# Altium footprint library DPIAT_202303.PcbLib: 77 footprints (part 4 of 5)
Each footprint in its own frame and in the unit in brackets; x right, y up, seen from the top. Pads: shape width x height; smd on the part's side, far side on the other; paste and mask are expansions set on the pad; w line width, h text height; cw(c..) or ccw(c..) is an arc to the next point about the centre after c.
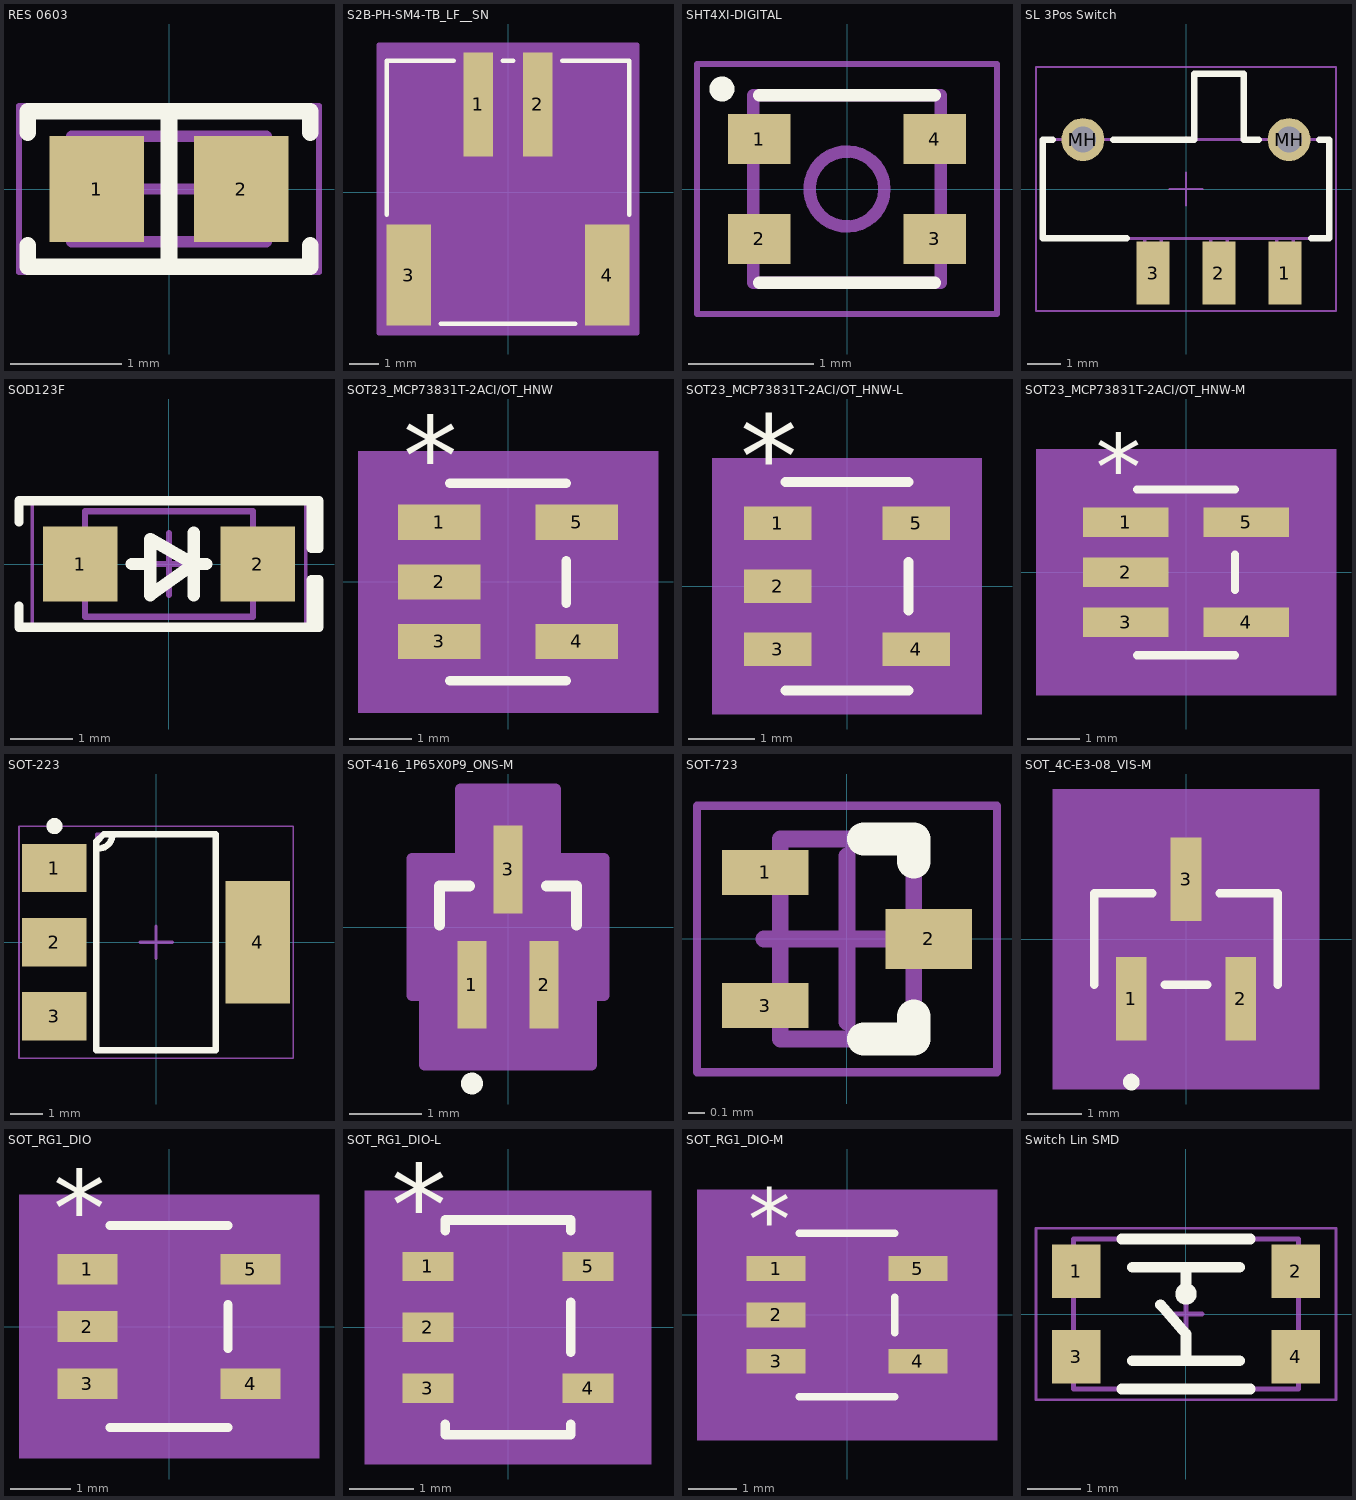
[diagram p3: the footprints below, top view; thin cyan lines are the x and y axes]

## RES 0603 [mm]
pads (2):
  rect 0.85x0.95 smd: 1(-0.65,0) 2(0.65,0)
Top Overlay:
  lines w0.15: -1.27,-0.508 -1.27,-0.7 1.27,-0.7 1.27,-0.508 ; -1.27,0.508 -1.27,0.7 1.27,0.7 1.27,0.508 ; 0,-0.7 0,0.7
Mechanical 13:
  lines w0.1: -0.875,-0.475 -0.875,0.475 0.875,0.475 0.875,-0.475 -0.875,-0.475
Mechanical 15:
  lines w0.05: -1.35,-0.75 -1.35,0.75 1.35,0.75 1.35,-0.75 -1.35,-0.75
  lines w0.1: -0.475,0 0.475,0 ; 0,-0.475 0,0.475
3D body "RES 0603.STEP": height 0.45, standoff 0, extent -0.825,-0.4 0.775,0.4

## S2B-PH-SM4-TB_LF__SN [mil] "Conn 2 pin smd horizontal S2B"
pads (4):
  rect 39x138 smd paste+0 mask+0: 1(-39.37,116.35) 2(39.37,116.35)
  rect 59x134 smd: 3(-131.89,-110.03) 4(131.89,-110.03)
Top Overlay:
  lines w6: -160.5,-29.93 -160.5,174.5 -71.97,174.5 ; -89.29,-174.5 89.29,-174.5 ; -6.77,174.5 6.77,174.5 ; 71.97,174.5 160.5,174.5 160.5,-29.93
Mechanical 5:
  region: -170.5,184.5 170.5,184.5 170.5,-184.5 -170.5,-184.5
Mechanical 13:
  lines w1: -155.5,-169.5 155.5,-169.5 155.5,169.5 -155.5,169.5 -155.5,-169.5
Mechanical 15:
  region: 171.39,195.35 -171.39,195.35 -171.39,-187.03 171.39,-187.03
  lines w6: -171.39,-187.03 -171.39,195.35 171.39,195.35 171.39,-187.03 -171.39,-187.03
3D body "S2B-PH-SM4-TB(LF)(SN)--3DModel-STEP-56544.STEP": height 216.54, standoff -3.94, extent -156.02,-169.29 155,169.29
3D body: height 10, standoff 0, extent 0,0 10,10

## SHT4XI-DIGITAL [mm]
pads (4):
  rect 0.5x0.4 smd: 1(-0.7,0.4) 2(-0.7,-0.4) 3(0.7,-0.4) 4(0.7,0.4)
Top Overlay:
  circle w0.1: c-1,0.8 r0.05
  lines w0.1: -0.7,-0.75 0.7,-0.75 ; -0.7,0.75 0.7,0.75
Mechanical 13:
  circle w0.1: c0,0 r0.3
  lines w0.1: -0.75,-0.75 0.75,-0.75 0.75,0.75 -0.75,0.75 -0.75,-0.75
Mechanical 15:
  lines w0.05: -1.2,-1 1.2,-1 1.2,1 -1.2,1 -1.2,-1
3D body "step_temp.STEP": height 0.59, standoff 0, extent -0.75,-0.75 0.75,0.75

## SL 3Pos Switch [mm] "Sliding 3 pos switch"
pads (5):
  rect 1x1.9 smd: 1(3,-2.55) 2(1,-2.55) 3(-1,-2.55)
  round 1.3 hole 0.8: MH(-3.125,1.5) MH(3.125,1.5)
Top Overlay:
  lines w0.2: -4.05,1.5 -4.35,1.5 -4.35,-1.5 -1.8,-1.5 ; -2.2,1.5 0.25,1.5 0.25,3.5 1.75,3.5 1.75,1.5 2.2,1.5 ; 3.8,-1.5 4.35,-1.5 4.35,1.5 4.05,1.5
Top Courtyard:
  lines w0.05: -0.5,0 0.5,0 ; 0,-0.5 0,0.5 ; -4.55,-3.7 4.55,-3.7 4.55,3.7 -4.55,3.7 -4.55,-3.7
Top Component Outline:
  lines w0.1: -1.25,-1.5 -1.25,-3 -0.75,-3 -0.75,-1.5 ; 0.25,1.5 0.25,3.5 1.75,3.5 1.75,1.5 ; 0.75,-1.5 0.75,-3 1.25,-3 1.25,-1.5 ; 2.75,-1.5 2.75,-3 3.25,-3 3.25,-1.5 ; -4.35,-1.5 -4.35,1.5 4.35,1.5 4.35,-1.5 -4.35,-1.5
3D body "450405020524.stp": height 1.98, standoff -0.62, extent -4.45,-3.05 4.45,3.5

## SOD123F [mm] "Footprint diode"
pads (2):
  rect 1.2x1.2 smd: 1(-1.427,0) 2(1.433,0)
Top Overlay:
  lines w0.15: -2.41,-0.675 -2.41,-1.016 2.289,-1.016 ; -2.41,0.675 -2.41,1.016 2.289,1.016 ; 2.289,-1.016 2.416,-1.016 2.416,-0.254 2.289,-0.254 2.289,-1.016 ; 2.289,1.016 2.289,0.254 2.416,0.254 2.416,1.016 2.289,1.016
  lines w0.2: -0.597,0 -0.297,0 ; 0.403,-0.5 0.403,0.5 ; 0.603,0 0.403,0 ; 0.403,0 -0.297,0.4 -0.297,-0.5 0.403,0
Mechanical 13:
  lines w0.1: -1.347,-0.85 -1.347,0.85 1.353,0.85 1.353,-0.85 -1.347,-0.85
Mechanical 15:
  lines w0.05: -2.197,-1 -2.197,1 2.203,1 2.203,-1 -2.197,-1
  lines w0.1: -0.497,0 0.503,0 ; 0.003,-0.5 0.003,0.5
3D body "SOD123F.STEP": height 1.1, standoff 0, extent -1.747,-0.8 1.753,0.8

## SOT23_MCP73831T-2ACI/OT_HNW [mil]
pads (5):
  rect 52x22 smd paste+0 mask+0: 1(-43.12,37.4) 2(-43.12,0) 3(-43.12,-37.4) 4(43.12,-37.4) 5(43.12,37.4)
Top Overlay:
  lines w6: -36.5,-62 36.5,-62 ; -36.5,62 36.5,62 ; 36.5,-13.3 36.5,13.3
  text "*" at -65.62,54.4 h50
Mechanical 5:
  region: 94.12,-82 -94.12,-82 -94.12,82 94.12,82
Mechanical 13:
  lines w0: -12,57 ccw(c0,57) 12,57
  lines w1: -55.12,-47.4 -31.5,-47.4 -31.5,-27.4 -55.12,-27.4 -55.12,-47.4 ; -55.12,-10 -31.5,-10 -31.5,10 -55.12,10 -55.12,-10 ; -55.12,27.4 -31.5,27.4 -31.5,47.4 -55.12,47.4 -55.12,27.4 ; -31.5,-57 -31.5,57 31.5,57 31.5,-57 -31.5,-57 ; 31.5,-47.4 55.12,-47.4 55.12,-27.4 31.5,-27.4 31.5,-47.4 ; 31.5,27.4 55.12,27.4 55.12,47.4 31.5,47.4 31.5,27.4
  text "*" at -29,4 h50
Mechanical 15:
  region: -41.5,-58.4 -79.12,-58.4 -79.12,58.4 -41.5,58.4 -41.5,67 41.5,67 41.5,58.4 79.12,58.4 79.12,-58.4 41.5,-58.4 41.5,-67 -41.5,-67
  lines w6: -79.12,-58.4 -41.5,-58.4 -41.5,-67 41.5,-67 41.5,-58.4 79.12,-58.4 79.12,58.4 41.5,58.4 41.5,67 -41.5,67 -41.5,58.4 -79.12,58.4 -79.12,-58.4
3D body: height 10, standoff 0, extent 0,0 10,10

## SOT23_MCP73831T-2ACI/OT_HNW-L [mil]
pads (5):
  rect 40x20 smd paste+0 mask+0: 1(-41.12,37.4) 2(-41.12,0) 3(-41.12,-37.4) 4(41.12,-37.4) 5(41.12,37.4)
Top Overlay:
  lines w6: -36.5,-62 36.5,-62 ; -36.5,62 36.5,62 ; 36.5,-14.3 36.5,14.3
  text "*" at -63.62,52.4 h50
Mechanical 5:
  region: 80.12,-76 -80.12,-76 -80.12,76 80.12,76
Mechanical 13:
  lines w0: -12,57 ccw(c0,57) 12,57
  lines w1: -55.12,-47.4 -55.12,-27.4 -31.5,-27.4 -31.5,-47.4 -55.12,-47.4 ; -55.12,-10 -55.12,10 -31.5,10 -31.5,-10 -55.12,-10 ; -55.12,27.4 -55.12,47.4 -31.5,47.4 -31.5,27.4 -55.12,27.4 ; -31.5,-57 31.5,-57 31.5,57 -31.5,57 -31.5,-57 ; 31.5,-47.4 31.5,-27.4 55.12,-27.4 55.12,-47.4 31.5,-47.4 ; 31.5,27.4 31.5,47.4 55.12,47.4 55.12,27.4 31.5,27.4
  text "*" at -29,4 h50
Mechanical 15:
  region: -35.5,-51.4 -65.12,-51.4 -65.12,51.4 -35.5,51.4 -35.5,61 35.5,61 35.5,51.4 65.12,51.4 65.12,-51.4 35.5,-51.4 35.5,-61 -35.5,-61
  lines w6: -65.12,-51.4 -65.12,51.4 -35.5,51.4 -35.5,61 35.5,61 35.5,51.4 65.12,51.4 65.12,-51.4 35.5,-51.4 35.5,-61 -35.5,-61 -35.5,-51.4 -65.12,-51.4
3D body: height 10, standoff 0, extent 0,0 10,10

## SOT23_MCP73831T-2ACI/OT_HNW-M [mil]
pads (5):
  rect 64x22 smd paste+0 mask+0: 1(-45.12,37.4) 2(-45.12,0) 3(-45.12,-37.4) 4(45.12,-37.4) 5(45.12,37.4)
Top Overlay:
  lines w6: -36.5,-62 36.5,-62 ; -36.5,62 36.5,62 ; 36.5,-13.3 36.5,13.3
  text "*" at -67.62,54.4 h50
Mechanical 5:
  region: 112.12,-92 -112.12,-92 -112.12,92 112.12,92
Mechanical 13:
  lines w0: -12,57 ccw(c0,57) 12,57
  lines w1: -55.12,-47.4 -55.12,-27.4 -31.5,-27.4 -31.5,-47.4 -55.12,-47.4 ; -55.12,-10 -55.12,10 -31.5,10 -31.5,-10 -55.12,-10 ; -55.12,27.4 -55.12,47.4 -31.5,47.4 -31.5,27.4 -55.12,27.4 ; -31.5,-57 31.5,-57 31.5,57 -31.5,57 -31.5,-57 ; 31.5,-47.4 31.5,-27.4 55.12,-27.4 55.12,-47.4 31.5,-47.4 ; 31.5,27.4 31.5,47.4 55.12,47.4 55.12,27.4 31.5,27.4
  text "*" at -29,4 h50
Mechanical 15:
  region: -51.5,-68.4 -97.12,-68.4 -97.12,68.4 -51.5,68.4 -51.5,77 51.5,77 51.5,68.4 97.12,68.4 97.12,-68.4 51.5,-68.4 51.5,-77 -51.5,-77
  lines w6: -97.12,-68.4 -97.12,68.4 -51.5,68.4 -51.5,77 51.5,77 51.5,68.4 97.12,68.4 97.12,-68.4 51.5,-68.4 51.5,-77 -51.5,-77 -51.5,-68.4 -97.12,-68.4
3D body: height 10, standoff 0, extent 0,0 10,10

## SOT-223 [mm] "For reg or other chip format SOT223"
pads (4):
  rect 2x1.5 smd: 1(-3.15,2.3) 2(-3.15,0) 3(-3.15,-2.3)
  rect 2x3.8 smd: 4(3.15,0)
Top Overlay:
  circle w0.25: c-3.15,3.6 r0.125
  lines w0.2: -1.85,2.9 -1.8,2.9 ccw(c-1.8,3.35) -1.35,3.35 ; -1.85,-3.35 1.85,-3.35 1.85,3.35 -1.625,3.35 -1.85,3.125 -1.85,-3.35
Mechanical 13:
  lines w0.1: -1.85,-3.35 -1.85,3.35 1.85,3.35 1.85,-3.35 -1.85,-3.35
Mechanical 15:
  lines w0.05: -4.25,-3.6 -4.25,3.6 4.25,3.6 4.25,-3.6 -4.25,-3.6
  lines w0.1: -0.5,0 0.5,0 ; 0,-0.5 0,0.5
3D body "SOT-223.STEP": height 1.8, standoff 0, extent -3.516,-3.25 3.5,3.25

## SOT-416_1P65X0P9_ONS-M [mil]
pads (3):
  rect 16x48 smd paste+0 mask+0: 1(-19.68,-31.5) 2(19.68,-31.5) 3(0,31.5)
Top Overlay:
  circle w6: c-19.68,-85.5 r3
  lines w6: -37.5,1.18 -37.5,22.5 -21.1,22.5 ; 21.1,22.5 37.5,22.5 37.5,1.18
Mechanical 13:
  circle w0: c-19.68,-7.5 r3
  lines w1: -32.5,-17.5 -32.5,17.5 32.5,17.5 32.5,-17.5 -32.5,-17.5 ; -25.68,-33.5 -13.69,-33.5 -13.69,-17.5 -25.68,-17.5 -25.68,-33.5 ; -6,17.5 -6,33.5 6,33.5 6,17.5 -6,17.5 ; 13.69,-33.5 25.68,-33.5 25.68,-17.5 13.69,-17.5 13.69,-33.5
Mechanical 15:
  region: -52.5,-37.5 -52.5,37.5 -26,37.5 -26,75.5 26,75.5 26,37.5 52.5,37.5 52.5,-37.5 45.69,-37.5 45.69,-75.5 -45.69,-75.5 -45.69,-37.5
  lines w6: -52.5,-37.5 -45.69,-37.5 -45.69,-75.5 45.69,-75.5 45.69,-37.5 52.5,-37.5 52.5,37.5 26,37.5 26,75.5 -26,75.5 -26,37.5 -52.5,37.5 -52.5,-37.5
3D body "SOT-416_1P65X0P9_ONS.step": height 35.12, standoff 0, extent -32.52,-33.5 32.52,33.5

## SOT-723 [mm] "For resistance NPN"
pads (3):
  rect 0.52x0.27 smd: 1(-0.49,0.4) 3(-0.49,-0.4)
  rect 0.52x0.36 smd: 2(0.49,0)
Top Overlay:
  lines w0.2: 0.1,-0.6 0.4,-0.6 0.4,-0.463 ; 0.1,0.6 0.4,0.6 0.4,0.463
Mechanical 13:
  lines w0.1: -0.4,-0.6 0.4,-0.6 0.4,0.6 -0.4,0.6 -0.4,-0.6
Mechanical 15:
  lines w0.05: -0.9,-0.8 0.9,-0.8 0.9,0.8 -0.9,0.8 -0.9,-0.8
  lines w0.1: -0.5,0 0.5,0 ; 0,-0.5 0,0.5
3D body "SOT-723.STEP": height 0.55, standoff 0, extent -0.6,-0.6 0.6,0.6

## SOT_4C-E3-08_VIS-M [mil]
pads (3):
  rect 22x60 smd paste+0 mask+0: 1(-39.37,-43) 2(39.37,-43) 3(0,43)
Top Overlay:
  circle w6: c-39.37,-103 r3
  lines w6: -66,-33 -66,33 -24.1,33 ; -15.27,-33 15.27,-33 ; 24.1,33 66,33 66,-33
Mechanical 5:
  region: -96,108 96,108 96,-108 -96,-108
Mechanical 13:
  circle w0: c-39.37,-18 r3
  lines w1: -61,-28 61,-28 61,28 -61,28 -61,-28 ; -48.37,-51 -48.37,-28 -30.37,-28 -30.37,-51 -48.37,-51 ; -9,28 9,28 9,51 -9,51 -9,28 ; 30.37,-51 30.37,-28 48.37,-28 48.37,-51 30.37,-51
Mechanical 15:
  region: -81,-48 -81,48 -29,48 -29,93 29,93 29,48 81,48 81,-48 68.37,-48 68.37,-93 -68.37,-93 -68.37,-48
  lines w6: -81,-48 -81,48 -29,48 -29,93 29,93 29,48 81,48 81,-48 68.37,-48 68.37,-93 -68.37,-93 -68.37,-48 -81,-48
3D body "SOT_4C-E3-08_VIS.step": height 45.12, standoff 0, extent -60.98,-50.98 60.98,50.98

## SOT_RG1_DIO [mil]
pads (5):
  rect 39.5x20 smd paste+0 mask+0: 1(-53.25,37.4) 2(-53.25,0) 3(-53.25,-37.4) 4(53.25,-37.4) 5(53.25,37.4)
Top Overlay:
  lines w6: -38.5,-66 38.5,-66 ; -38.5,66 38.5,66 ; 38.5,-14.3 38.5,14.3
  text "*" at -75.75,52.4 h50
Mechanical 5:
  region: 98,-86 -98,-86 -98,86 98,86
Mechanical 13:
  lines w0: -12,61 ccw(c0,61) 12,61
  lines w1: -59,-47.4 -33.5,-47.4 -33.5,-27.4 -59,-27.4 -59,-47.4 ; -59,-10 -33.5,-10 -33.5,10 -59,10 -59,-10 ; -59,27.4 -33.5,27.4 -33.5,47.4 -59,47.4 -59,27.4 ; -33.5,-61 -33.5,61 33.5,61 33.5,-61 -33.5,-61 ; 33.5,-47.4 59,-47.4 59,-27.4 33.5,-27.4 33.5,-47.4 ; 33.5,27.4 59,27.4 59,47.4 33.5,47.4 33.5,27.4
  text "*" at -36,9.4 h50
Mechanical 15:
  region: 43.5,-71 -43.5,-71 -43.5,-52.4 -79,-52.4 -79,52.4 -43.5,52.4 -43.5,71 43.5,71 43.5,52.4 79,52.4 79,-52.4 43.5,-52.4
  lines w6: -79,-52.4 -79,52.4 -43.5,52.4 -43.5,71 43.5,71 43.5,52.4 79,52.4 79,-52.4 43.5,-52.4 43.5,-71 -43.5,-71 -43.5,-52.4 -79,-52.4
3D body "SOT_RG1_DIO.step": height 51.1, standoff 0, extent -59.02,-60.98 59.02,60.98

## SOT_RG1_DIO-L [mil]
pads (5):
  rect 31.5x18 smd paste+0 mask+0: 1(-49.25,37.4) 2(-49.25,0) 3(-49.25,-37.4) 4(49.25,-37.4) 5(49.25,37.4)
Top Overlay:
  lines w6: -38.5,-59.5 -38.5,-66 38.5,-66 38.5,-59.5 ; -38.5,59.5 -38.5,66 38.5,66 38.5,59.5 ; 38.5,-15.3 38.5,15.3
  text "*" at -71.75,50.4 h50
Mechanical 5:
  region: 88,-84 -88,-84 -88,84 88,84
Mechanical 13:
  lines w0: -12,61 ccw(c0,61) 12,61
  lines w1: -59,-47.4 -59,-27.4 -33.5,-27.4 -33.5,-47.4 -59,-47.4 ; -59,-10 -59,10 -33.5,10 -33.5,-10 -59,-10 ; -59,27.4 -59,47.4 -33.5,47.4 -33.5,27.4 -59,27.4 ; -33.5,-61 33.5,-61 33.5,61 -33.5,61 -33.5,-61 ; 33.5,-47.4 33.5,-27.4 59,-27.4 59,-47.4 33.5,-47.4 ; 33.5,27.4 33.5,47.4 59,47.4 59,27.4 33.5,27.4
  text "*" at -36,7.4 h50
Mechanical 15:
  region: 41.5,-69 -41.5,-69 -41.5,-55.4 -76,-55.4 -76,55.4 -41.5,55.4 -41.5,69 41.5,69 41.5,55.4 76,55.4 76,-55.4 41.5,-55.4
  lines w6: -76,-55.4 -41.5,-55.4 -41.5,-69 41.5,-69 41.5,-55.4 76,-55.4 76,55.4 41.5,55.4 41.5,69 -41.5,69 -41.5,55.4 -76,55.4 -76,-55.4
3D body "SOT_RG1_DIO.step": height 51.1, standoff 0, extent -59.02,-60.98 59.02,60.98

## SOT_RG1_DIO-M [mil]
pads (5):
  rect 47.5x20 smd paste+0 mask+0: 1(-57.25,37.4) 2(-57.25,0) 3(-57.25,-37.4) 4(57.25,-37.4) 5(57.25,37.4)
Top Overlay:
  lines w6: -38.5,-66 38.5,-66 ; -38.5,66 38.5,66 ; 38.5,-14.3 38.5,14.3
  text "*" at -79.75,52.4 h50
Mechanical 5:
  region: 121,-101 -121,-101 -121,101 121,101
Mechanical 13:
  lines w0: -12,61 ccw(c0,61) 12,61
  lines w1: -59,-47.4 -33.5,-47.4 -33.5,-27.4 -59,-27.4 -59,-47.4 ; -59,-10 -33.5,-10 -33.5,10 -59,10 -59,-10 ; -59,27.4 -33.5,27.4 -33.5,47.4 -59,47.4 -59,27.4 ; -33.5,-61 -33.5,61 33.5,61 33.5,-61 -33.5,-61 ; 33.5,-47.4 59,-47.4 59,-27.4 33.5,-27.4 33.5,-47.4 ; 33.5,27.4 59,27.4 59,47.4 33.5,47.4 33.5,27.4
  text "*" at -36,9.4 h50
Mechanical 15:
  region: 58.5,-86 -58.5,-86 -58.5,-57.4 -94,-57.4 -94,57.4 -58.5,57.4 -58.5,86 58.5,86 58.5,57.4 94,57.4 94,-57.4 58.5,-57.4
  lines w6: -94,-57.4 -94,57.4 -58.5,57.4 -58.5,86 58.5,86 58.5,57.4 94,57.4 94,-57.4 58.5,-57.4 58.5,-86 -58.5,-86 -58.5,-57.4 -94,-57.4
3D body "SOT_RG1_DIO.step": height 51.1, standoff 0, extent -59.02,-60.98 59.02,60.98

## Switch Lin SMD [mm]
pads (4):
  rect 0.9x1 smd mask+0.1: 1(-2.05,0.802) 2(2.05,0.802) 3(-2.05,-0.798) 4(2.05,-0.798)
Top Overlay:
  circle w0.2: c0,0.377 r0.1
  lines w0.2: -1.2,-1.398 1.2,-1.398 ; -1.2,1.402 1.2,1.402 ; -1,-0.873 1,-0.873 ; -1,0.877 1,0.877 ; -0.475,0.177 0,-0.373 0,-0.873 ; 0,0.377 0,0.877
Mechanical 13:
  lines w0.1: -2.1,-1.398 -2.1,1.402 2.1,1.402 2.1,-1.398 -2.1,-1.398
Mechanical 15:
  lines w0.05: -2.8,-1.598 -2.8,1.602 2.8,1.602 2.8,-1.598 -2.8,-1.598
  lines w0.1: -0.3,0.002 0.3,0.002 ; 0,-0.298 0,0.302
3D body "C&K - KMR7.step": height 2.5, standoff 0, extent -2.3,-1.398 2.3,1.402